# Altium footprint library SMD Passive.PcbLib: 136 footprints (part 3 of 9)
Each footprint in its own frame and in the unit in brackets; x right, y up, seen from the top. Pads: shape width x height; smd on the part's side, far side on the other; paste and mask are expansions set on the pad; w line width, h text height; cw(c..) or ccw(c..) is an arc to the next point about the centre after c.
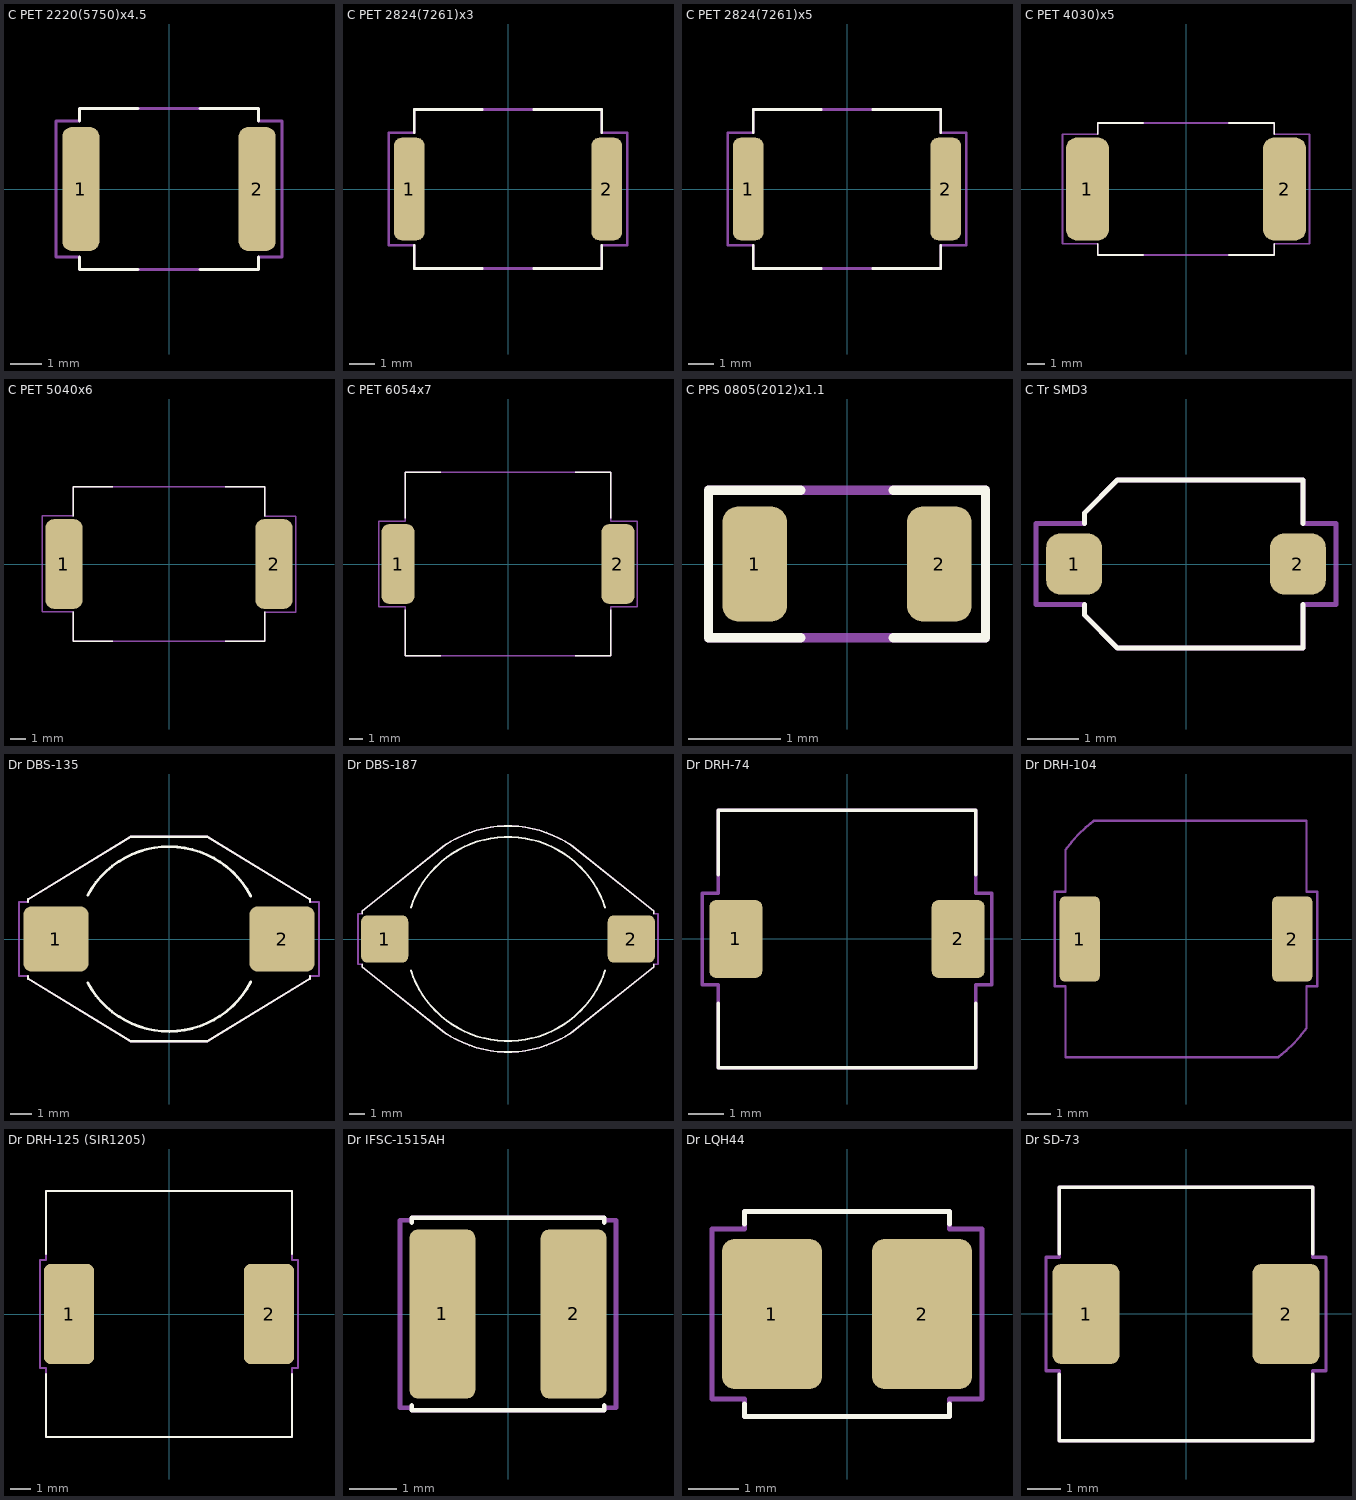
[diagram p2: the footprints below, top view; thin cyan lines are the x and y axes]

## C PET 2220(5750)x4.5 [mm]
height 4.5
pads (2):
  rrect50% 1.2x4 smd: 1(-2.85,0) 2(2.85,0)
Top Overlay:
  lines w0.1: -2.9,-2.2 -2.9,-2.6 -1,-2.6 ; -2.9,2.2 -2.9,2.6 -1,2.6 ; 1,-2.6 2.9,-2.6 2.9,-2.2 ; 1,2.6 2.9,2.6 2.9,2.2
Top Courtyard:
  lines w0.1: -3.65,-2.2 -2.9,-2.2 -2.9,-2.6 2.9,-2.6 2.9,-2.2 3.65,-2.2 3.65,2.2 2.9,2.2 2.9,2.6 -2.9,2.6 -2.9,2.2 -3.65,2.2 -3.65,-2.2
3D body "Cap 2220x4.5.STEP": height 4.5, standoff 0, extent -2.85,-2.55 2.85,2.55

## C PET 2824(7261)x3 [mm]
height 3
pads (2):
  rrect50% 1.2x4 smd: 1(-3.85,0) 2(3.85,0)
Top Overlay:
  lines w0.1: -3.65,-2.2 -3.65,-3.1 -1,-3.1 ; -3.65,2.2 -3.65,3.1 -1,3.1 ; 1,-3.1 3.65,-3.1 3.65,-2.2 ; 1,3.1 3.65,3.1 3.65,2.2
Top Courtyard:
  lines w0.1: -4.65,-2.2 -3.65,-2.2 -3.65,-3.1 3.65,-3.1 3.65,-2.2 4.65,-2.2 4.65,2.2 3.65,2.2 3.65,3.1 -3.65,3.1 -3.65,2.2 -4.65,2.2 -4.65,-2.2
3D body "Cap 2824x3.0.STEP": height 3, standoff 0, extent -3.6,-3.05 3.6,3.05

## C PET 2824(7261)x5 [mm]
height 5
pads (2):
  rrect50% 1.2x4 smd: 1(-3.85,0) 2(3.85,0)
Top Overlay:
  lines w0.1: -3.65,-2.2 -3.65,-3.1 -1,-3.1 ; -3.65,2.2 -3.65,3.1 -1,3.1 ; 1,-3.1 3.65,-3.1 3.65,-2.2 ; 1,3.1 3.65,3.1 3.65,2.2
Top Courtyard:
  lines w0.1: -4.65,-2.2 -3.65,-2.2 -3.65,-3.1 3.65,-3.1 3.65,-2.2 4.65,-2.2 4.65,2.2 3.65,2.2 3.65,3.1 -3.65,3.1 -3.65,2.2 -4.65,2.2 -4.65,-2.2
3D body "Cap 2824x5.0.STEP": height 5, standoff 0, extent -3.6,-3.05 3.6,3.05

## C PET 4030)x5 [mm]
height 5
pads (2):
  rrect50% 2.5x6 smd: 1(-5.75,0) 2(5.75,0)
Top Overlay:
  lines w0.1: -5.15,-3.2 -5.15,-3.85 -2.5,-3.85 ; -5.15,3.2 -5.15,3.85 -2.5,3.85 ; 2.5,-3.85 5.15,-3.85 5.15,-3.2 ; 2.5,3.85 5.15,3.85 5.15,3.2
Top Courtyard:
  lines w0.1: -7.2,-3.2 -7.2,3.2 -5.15,3.2 -5.15,3.85 5.15,3.85 5.15,3.2 7.2,3.2 7.2,-3.2 5.15,-3.2 5.15,-3.85 -5.15,-3.85 -5.15,-3.2 -7.2,-3.2
3D body "Cap 4030x5.0.STEP": height 5, standoff 0, extent -5.1,-3.8 5.1,3.8

## C PET 5040x6 [mm]
height 6
pads (2):
  rrect50% 2.5x6 smd: 1(-7,0) 2(7,0)
Top Overlay:
  lines w0.1: -6.4,-3.2 -6.4,-5.15 -3.75,-5.15 ; -6.4,3.2 -6.4,5.15 -3.75,5.15 ; 3.75,-5.15 6.4,-5.15 6.4,-3.2 ; 3.75,5.15 6.4,5.15 6.4,3.2
Top Courtyard:
  lines w0.1: -8.45,-3.2 -6.4,-3.2 -6.4,-5.15 6.4,-5.15 6.4,-3.2 8.45,-3.2 8.45,3.2 6.4,3.2 6.4,5.15 -6.4,5.15 -6.4,3.2 -8.45,3.2 -8.45,-3.2
3D body "Cap 5040x6.0.STEP": height 6, standoff 0, extent -6.35,-5.1 6.35,5.1

## C PET 6054x7 [mm]
height 7
pads (2):
  rrect50% 2.5x6 smd: 1(-8.25,0) 2(8.25,0)
Top Overlay:
  lines w0.1: -7.7,-3.425 -7.7,-6.9 -5.05,-6.9 ; -7.7,3.425 -7.7,6.9 -5.05,6.9 ; 5.05,-6.9 7.7,-6.9 7.7,-3.425 ; 5.05,6.9 7.7,6.9 7.7,3.425
Top Courtyard:
  lines w0.1: -9.7,-3.2 -7.7,-3.2 -7.7,-6.9 7.7,-6.9 7.7,-3.2 9.7,-3.2 9.7,3.2 7.7,3.2 7.7,6.9 -7.7,6.9 -7.7,3.2 -9.7,3.2 -9.7,-3.2
3D body "Cap 6054x7.0.STEP": height 7, standoff 0, extent -7.65,-6.85 7.65,6.85

## C PPS 0805(2012)x1.1 [mm]
height 1.1
pads (2):
  rrect50% 0.7x1.25 smd: 1(-1,0) 2(1,0)
Top Overlay:
  lines w0.1: -0.5,-0.8 -1.5,-0.8 -1.5,0.8 -0.5,0.8 ; 0.5,-0.8 1.5,-0.8 1.5,0.8 0.5,0.8
Top Courtyard:
  lines w0.1: -1.5,-0.8 1.5,-0.8 1.5,0.8 -1.5,0.8 -1.5,-0.8
3D body "Cap 0805(2012)x1.1.STEP": height 1.13, standoff -0.03, extent -1,-0.682 1,0.624

## C Tr SMD3 [mm]
pads (2):
  rrect50% 1.1x1.2 smd: 1(-2.2,0) 2(2.2,0)
Top Overlay:
  lines w0.1: -2,-0.8 -2,-1 -1.35,-1.65 2.3,-1.65 2.3,-0.8 ; -2,0.8 -2,1 -1.35,1.65 2.3,1.65 2.3,0.8
Top Courtyard:
  lines w0.1: -2.95,-0.8 -2,-0.8 -2,-1 -1.35,-1.65 2.3,-1.65 2.3,-0.8 2.95,-0.8 2.95,0.8 2.3,0.8 2.3,1.65 -1.35,1.65 -2,1 -2,0.8 -2.95,0.8 -2.95,-0.8
3D body "Cap Trimer SMD TZC3R100A110B00.STEP": height 1.6, standoff 0, extent -2.25,-1.6 2.25,1.6

## Dr DBS-135 [mm]
pads (2):
  rrect25% 3x3 smd: 1(-5.2,0) 2(5.2,0)
Top Overlay:
  lines w0.1: -6.48,-1.7 -6.48,-1.829 -1.778,-4.7 1.773,-4.7 ; -6.48,1.7 -6.48,1.829 -1.777,4.7 1.773,4.7 ; 1.777,4.7 6.479,1.83 ; 1.777,-4.7 6.48,-1.829 6.48,-1.7 ; 6.479,1.7 6.479,1.829
  lines w0.125: -3.741,-2.018 ccw(c0,0) 3.761,-1.979 ; -3.741,2.018 cw(c0,0) 3.761,1.979
Top Courtyard:
  lines w0.1: 1.773,-4.7 -1.778,-4.7 -6.48,-1.829 -6.48,-1.7 -6.9,-1.7 -6.9,1.7 -6.48,1.7 -6.48,1.829 -1.777,4.7 1.773,4.7 ; 1.777,4.7 6.479,1.83 ; 1.777,-4.7 6.48,-1.829 6.48,-1.7 6.9,-1.7 6.9,1.7 6.479,1.7 6.479,1.829
3D body "DO3316P 13x9.4x5.2.STEP": height 5.21, standoff 0, extent -6.48,-4.7 6.48,4.7

## Dr DBS-187 [mm]
pads (2):
  rrect25% 3x3 smd: 1(-7.85,0) 2(7.85,0)
Top Overlay:
  lines w0.1: -9.27,-1.6 -9.27,-1.808 -4.027,-5.968 ; -9.27,1.598 -9.27,1.808 -4.027,5.968 ; -4.027,-5.969 ccw(c0,0) 4.027,-5.969 ; -4.027,5.969 cw(c0,0) 4.027,5.969 ; 4.027,-5.968 9.27,-1.808 9.27,-1.6 ; 4.027,5.968 9.27,1.808 9.27,1.6
  lines w0.125: -6.186,-1.996 ccw(c0,0) 6.186,-1.996 ; -6.186,1.995 cw(c0,0) 6.186,1.995
Top Courtyard:
  lines w0.1: -4.027,-5.969 ccw(c0,0) 4.027,-5.969 ; -4.027,-5.968 -9.27,-1.808 -9.27,-1.6 -9.55,-1.6 -9.55,1.6 -9.27,1.6 -9.27,1.808 -4.027,5.968 ; -4.027,5.969 cw(c0,0) 4.027,5.969 ; 4.027,-5.968 9.27,-1.808 9.27,-1.6 9.55,-1.6 9.55,1.6 9.27,1.6 9.27,1.808 4.027,5.968
3D body "Dr DBS-187.STEP": height 4.85, standoff 0.1, extent -9.27,-7.2 9.27,7.3

## Dr DRH-74 [mm]
pads (2):
  rrect25% 1.5x2.2 smd: 1(-3.15,0) 2(3.15,0)
Top Overlay:
  lines w0.1: -3.65,-1.825 -3.65,-3.65 3.65,-3.65 3.65,-1.825 ; -3.65,1.825 -3.65,3.65 3.65,3.65 3.65,1.825
Top Courtyard:
  lines w0.1: -4.1,-1.3 -3.65,-1.3 -3.65,-3.65 3.65,-3.65 3.65,-1.3 4.1,-1.3 4.1,1.3 3.65,1.3 3.65,3.65 -3.65,3.65 -3.65,1.3 -4.1,1.3 -4.1,-1.3
3D body "DR-74.STEP": height 4.35, standoff 0, extent -3.65,-3.65 3.65,3.65

## Dr DRH-104 [mm]
pads (2):
  rrect25% 1.7x3.6 smd: 1(-4.5,0) 2(4.5,0)
Top Courtyard:
  lines w0.1: -5.55,-2 -5.55,2 -5.1,2 -5.1,3.783 cw(c0,0) -3.914,5 5.1,5 5.1,2 5.55,2 5.55,-2 5.1,-2 5.1,-3.783 cw(c0,0) 3.914,-5 -5.1,-5 -5.1,-2 -5.55,-2
3D body "MSS1038 10x10x3.8.STEP": height 3.8, standoff -0.01, extent -5.105,-5 5.105,5

## Dr DRH-125 (SIR1205) [mm]
pads (2):
  rrect25% 2.5x5 smd: 1(-5,0) 2(5,0)
Top Overlay:
  lines w0.1: -6.15,-3 -6.15,-6.15 6.15,-6.15 6.15,-3 ; -6.15,3 -6.15,6.15 6.15,6.15 6.15,3
Top Courtyard:
  lines w0.1: -6.45,-2.7 -6.15,-2.7 -6.15,-6.15 6.15,-6.15 6.15,-2.7 6.45,-2.7 6.45,2.7 6.15,2.7 6.15,6.15 -6.15,6.15 -6.15,2.7 -6.45,2.7 -6.45,-2.7
3D body "MSS1260 12x12x6.STEP": height 6.2, standoff 0.06, extent -6.15,-6.15 6.15,6.15

## Dr IFSC-1515AH [mm]
pads (2):
  rrect25% 1.4x3.6 smd: 1(-1.397,0) 2(1.397,0)
Top Overlay:
  lines w0.1: -2.05,-1.95 -2.05,-2.05 2.05,-2.05 2.05,-1.95 ; -2.05,1.95 -2.05,2.05 2.05,2.05 2.05,1.95
Top Courtyard:
  lines w0.1: -2.3,-2 -2.3,2 -2.05,2 -2.05,2.05 2.05,2.05 2.05,2 2.3,2 2.3,-2 2.05,-2 2.05,-2.05 -2.05,-2.05 -2.05,-2 -2.3,-2
3D body "IFSC-1515AH.STEP": height 1.8, standoff 0, extent -1.975,-1.975 1.975,1.975

## Dr LQH44 [mm] "4x4x1.65mm"
height 1.65
pads (2):
  rrect25% 2x3 smd: 1(-1.5,0) 2(1.5,0)
Top Overlay:
  lines w0.1: -2.05,-1.8 -2.05,-2.05 2.05,-2.05 2.05,-1.8 ; -2.05,1.8 -2.05,2.05 2.05,2.05 2.05,1.8
Top Courtyard:
  lines w0.1: -2.7,-1.7 -2.05,-1.7 -2.05,-2.05 2.05,-2.05 2.05,-1.7 2.7,-1.7 2.7,1.7 2.05,1.7 2.05,2.05 -2.05,2.05 -2.05,1.7 -2.7,1.7 -2.7,-1.7
3D body "LQH44PN P0.STEP": height 1.65, standoff 0, extent -2,-1.997 2,1.998

## Dr SD-73 [mm] "7x7x3.2mm"
height 3.2
pads (2):
  rrect25% 2x3 smd: 1(-3,0) 2(3,0)
Top Overlay:
  lines w0.1: -3.8,-1.8 -3.8,-3.8 3.8,-3.8 3.8,-1.8 ; -3.8,1.8 -3.8,3.8 3.8,3.8 3.8,1.8
Top Courtyard:
  lines w0.1: -4.2,-1.7 -3.8,-1.7 -3.8,-3.8 3.8,-3.8 3.8,-1.7 4.2,-1.7 4.2,1.7 3.8,1.7 3.8,3.8 -3.8,3.8 -3.8,1.7 -4.2,1.7 -4.2,-1.7
3D body "DR73-74.STEP": height 3.55, standoff 0, extent -3.8,-3.8 3.8,3.8